# Altium footprint library altium_parts_templates_PCB.PcbLib: 93 footprints (part 6 of 6)
Each footprint in its own frame and in the unit in brackets; x right, y up, seen from the top. Pads: shape width x height; smd on the part's side, far side on the other; paste and mask are expansions set on the pad; w line width, h text height; cw(c..) or ccw(c..) is an arc to the next point about the centre after c.
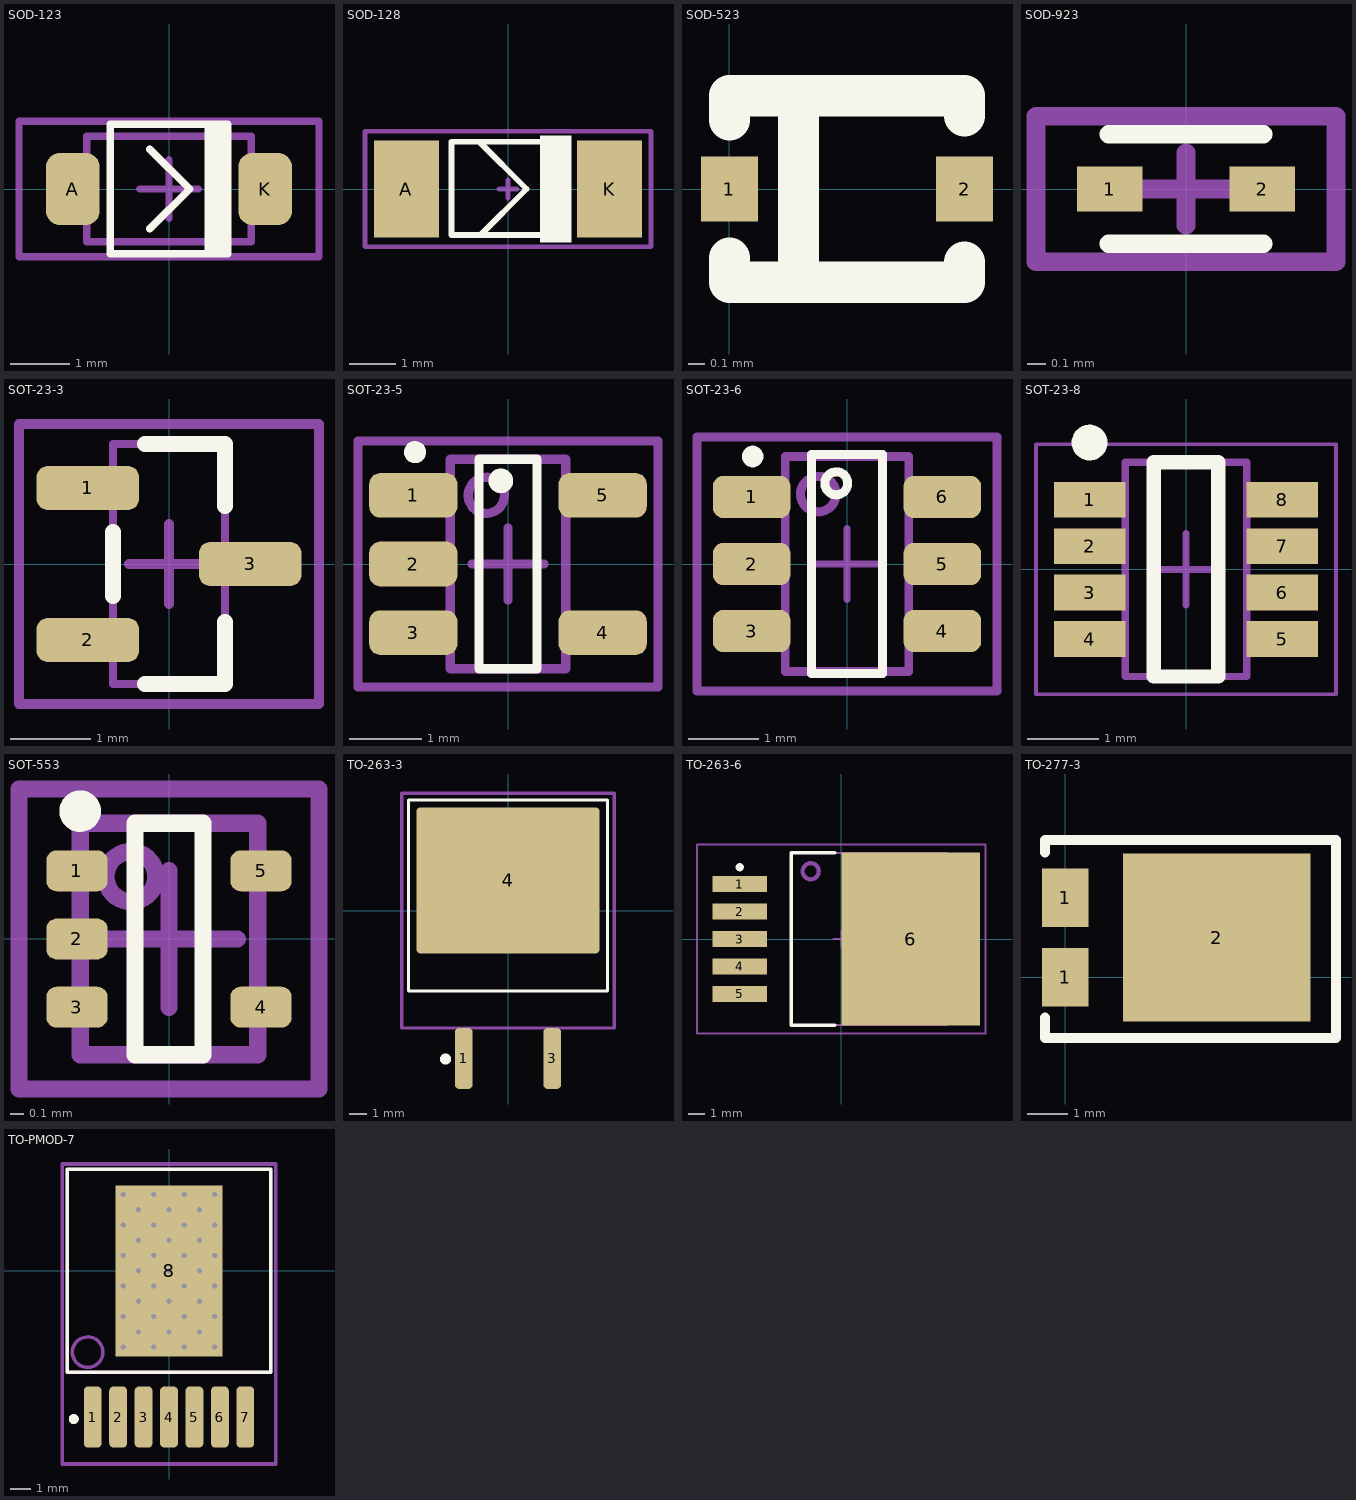
[diagram p5: the footprints below, top view; thin cyan lines are the x and y axes]

## SOD-123 [mm] "SOD-123"
height 1.35
pads (2):
  rrect50% 0.91x1.22 smd paste+0 mask+0.07: A(-1.635,0) K(1.635,0)
Top Overlay:
  rectangle: 0.6,-1.1 1,1.1
  lines w0.127: -0.325,-0.675 0.35,0 -0.325,0.675 ; -1,-1.1 1,-1.1 1,1.1 -1,1.1 -1,-1.1
Top Assembly Drawing:
  lines w0.127: -0.325,-0.675 0.35,0 -0.325,0.675 ; 0.954,-0.9 0.954,0.9 ; -1.4,-0.9 1.4,-0.9 1.4,0.9 -1.4,0.9 -1.4,-0.9
Top Courtyard:
  lines w0.127: -0.5,0 0.5,0 ; 0,-0.5 0,0.5 ; -2.55,-1.15 2.55,-1.15 2.55,1.15 -2.55,1.15 -2.55,-1.15
3D body "TSOP127P370X135-2N.step": height 1.35, standoff 0, extent -1.855,-0.9 1.855,0.9

## SOD-128 [mm] "SOD-128"
pads (2):
  rect 1.4x2.1 smd: A(-2.2,0) K(2.2,0)
Top Overlay:
  region: 1.375,1.15 1.375,-1.15 0.7,-1.15 0.7,1.15
  lines w0.127: 1.138,1.025 -1.225,1.025 ; 1.175,-1 -1.225,-1 ; -1.225,-1 -1.225,1.025 ; -1.225,-1 -0.6,-1 0.4,0 -0.625,1.025 -1.225,1.025
Top Courtyard:
  lines w0.102: -0.2,0 0.2,0 ; 0,-0.2 0,0.2 ; -3.1,-1.25 3.1,-1.25 3.1,1.25 -3.1,1.25 -3.1,-1.25

## SOD-523 [mm] "Vishay - SOD-523"
height 0.711
pads (2):
  rect 0.35x0.4 smd: 1(0,0) 2(1.45,0)
Top Overlay:
  lines w0.254: 0,-0.425 0,-0.575 1.2,-0.575 1.45,-0.575 1.45,-0.45 ; 0,0.425 0,0.575 1.2,0.575 1.45,0.575 1.45,0.45 ; 0.425,-0.575 0.425,0.575
3D body: height 0.71, standoff 0, extent 0.175,-0.5 1.275,0.5
3D body: height 0.2, standoff 0, extent -0.125,-0.15 0.375,0.15
3D body: height 0.2, standoff 0, extent 1.075,-0.15 1.575,0.15

## SOD-923 [mm] "SOD-923"
pads (2):
  rect 0.36x0.25 smd: 1(-0.42,0) 2(0.42,0)
Top Overlay:
  lines w0.102: -0.425,-0.3 0.425,-0.3 ; -0.425,0.3 0.425,0.3
Top Courtyard:
  lines w0.102: -0.25,0 0.25,0 ; 0,-0.2 0,0.2 ; -0.825,-0.4 -0.825,0.4 0.825,0.4 0.825,-0.4 -0.825,-0.4

## SOT-23-3 [mm] "SOT-23-3, TO-236-3, SC-59"
height 1.1
pads (3):
  rrect50% 1.28x0.55 smd mask+0.07: 1(-1.015,0.95) 2(-1.015,-0.95) 3(1.015,0)
Top Overlay:
  lines w0.2: -0.7,-0.4 -0.7,0.4 ; -0.3,-1.5 0.7,-1.5 0.7,-0.725 ; -0.3,1.5 0.7,1.5 0.7,0.725
Top Assembly Drawing:
  lines w0.1: -0.7,-1.5 -0.7,1.5 0.7,1.5 0.7,-1.5 -0.7,-1.5
Top Courtyard:
  lines w0.127: -0.5,0 0.5,0 ; 0,-0.5 0,0.5 ; -1.875,-1.75 -1.875,1.75 1.875,1.75 1.875,-1.75 -1.875,-1.75
3D body "FMMT560QTADICT-ND.step": height 1.1, standoff 0, extent -1.25,-1.5 1.25,1.5

## SOT-23-5 [mm] "SOT-23-5, TSOT-23-5"
height 1
pads (5):
  rrect50% 1.22x0.62 smd paste+0 mask+0.07: 1(-1.31,0.95) 2(-1.31,0) 3(-1.31,-0.95) 4(1.31,-0.95) 5(1.31,0.95)
Top Overlay:
  circle w0.2: c-0.1,1.15 r0.071
  circle w0.152: c-1.286,1.547 r0.076
  lines w0.127: -0.4,-1.45 0.4,-1.45 0.4,1.45 -0.4,1.45 -0.4,-1.45
Top Assembly Drawing:
  circle w0.127: c-0.3,0.95 r0.25
  lines w0.127: -0.8,-1.45 -0.8,1.45 0.8,1.45 0.8,-1.45 -0.8,-1.45
Top Courtyard:
  lines w0.127: -0.5,0 0.5,0 ; 0,-0.5 0,0.5 ; -2.075,-1.7 -2.075,1.7 2.075,1.7 2.075,-1.7 -2.075,-1.7
3D body "SOT23127P600-8N.step": height 0.87, standoff 0, extent -1.4,-1.45 1.4,1.45

## SOT-23-6 [mm] "SOT-23-6, TSOT-23-6"
height 1.1
pads (6):
  rrect50% 1.1x0.6 smd paste+0 mask+0.07: 1(-1.35,0.95) 2(-1.35,0) 3(-1.35,-0.95) 4(1.35,-0.95) 5(1.35,0) 6(1.35,0.95)
Top Overlay:
  circle w0.152: c-1.337,1.523 r0.076
  circle w0.127: c-0.152,1.143 r0.163
  lines w0.127: -0.5,-1.55 -0.5,1.55 0.5,1.55 0.5,-1.55 -0.5,-1.55
Top Assembly Drawing:
  circle w0.127: c-0.406,0.991 r0.251
  lines w0.127: -0.875,-1.525 0.875,-1.525 0.875,1.525 -0.875,1.525 -0.875,-1.525
Top Courtyard:
  lines w0.1: -0.5,0 0.5,0 ; 0,-0.5 0,0.5
  lines w0.127: -2.125,-1.8 2.125,-1.8 2.125,1.8 -2.125,1.8 -2.125,-1.8
3D body "SOT23127P600-8N.step": height 1.1, standoff 0, extent -1.525,-1.525 1.525,1.525

## SOT-23-8 [mm] "SOT-23-8"
height 1.45
pads (8):
  rect 1x0.5 smd: 1(-1.35,0.975) 2(-1.35,0.325) 3(-1.35,-0.325) 4(-1.35,-0.975) 5(1.35,-0.975) 6(1.35,-0.325) 7(1.35,0.325) 8(1.35,0.975)
Top Overlay:
  circle w0.25: c-1.35,1.775 r0.125
  lines w0.2: -0.45,-1.5 -0.45,1.5 0.45,1.5 0.45,-1.5 -0.45,-1.5
Top 3D Model:
  lines w0.1: -0.85,-1.5 -0.85,1.5 0.85,1.5 0.85,-1.5 -0.85,-1.5
Top Courtyard:
  lines w0.05: -2.1,-1.75 -2.1,1.75 2.1,1.75 2.1,-1.75 -2.1,-1.75
  lines w0.1: -0.5,0 0.5,0 ; 0,-0.5 0,0.5
3D body "SOT23-8.step": height 1.2, standoff 0, extent -1.4,-1.47 1.4,1.47

## SOT-553 [mm]
height 0.6
pads (5):
  rrect50% 0.45x0.3 smd paste+0.05 mask+0.05: 1(-0.675,0.5) 2(-0.675,0) 3(-0.675,-0.5) 4(0.675,-0.5) 5(0.675,0.5)
Top Overlay:
  circle w0.152: c-0.651,0.938 r0.076
  lines w0.127: -0.25,-0.85 0.25,-0.85 0.25,0.85 -0.25,0.85 -0.25,-0.85
Top Assembly Drawing:
  circle w0.127: c-0.279,0.457 r0.183
  lines w0.127: -0.65,-0.85 -0.65,0.85 0.65,0.85 0.65,-0.85 -0.65,-0.85
Top Courtyard:
  lines w0.127: -0.5,0 0.5,0 ; 0,-0.5 0,0.5 ; -1.1,-1.1 -1.1,1.1 1.1,1.1 1.1,-1.1 -1.1,-1.1
3D body "User Library-sot-553.STEP": height 0.49, standoff -0.01, extent -0.8,-0.8 0.8,0.8

## TO-263-3 [mm] "TO-263-3, D2PAK, TO-263AB"
height 4.83
pads (3):
  rrect50% 1.016x3.504 smd paste+0 mask+0.102: 1(-2.54,-8.475) 3(2.54,-8.475)
  rrect5% 10.49x8.38 smd paste-5.245 mask+0.102: 4(0,1.737)
Top Overlay:
  circle w0.381: c-3.581,-8.509 r0.127
  lines w0.175: -5.715,-4.6 -5.715,6.35 5.715,6.35 5.715,-4.6 -5.715,-4.6
Top Paste:
  region: 3.1,3.087 1.3,3.087 1.3,0.487 3.1,0.487
  region: 5.2,3.087 3.4,3.087 3.4,0.487 5.2,0.487
  region: 5.2,5.9 3.4,5.9 3.4,3.3 5.2,3.3
  region: 3.1,5.9 1.3,5.9 1.3,3.3 3.1,3.3
  region: 5.2,0.187 3.4,0.187 3.4,-2.413 5.2,-2.413
  region: 3.1,0.187 1.3,0.187 1.3,-2.413 3.1,-2.413
  rectangle: -1,-2.413 1,0.187
  rectangle: -3.1,-2.413 -1.3,0.187
  rectangle: -5.2,-2.413 -3.4,0.187
  rectangle: -1,3.3 1,5.9
  rectangle: -3.1,3.3 -1.3,5.9
  rectangle: -5.2,3.3 -3.4,5.9
  rectangle: -5.2,0.487 -3.4,3.087
  rectangle: -3.1,0.487 -1.3,3.087
  rectangle: -1,0.487 1,3.087
Top Courtyard:
  lines w0.175: -0.5,0 0,0 ; 0,-0.5 0,0 ; 0,0.5 0,0 ; 0.5,0 0,0 ; -6.096,-6.722 6.096,-6.722 6.096,6.74 -6.096,6.74 -6.096,-6.722
3D body "D2PAK.step": height 4.98, standoff -0.03, extent -5.054,-9.458 5.106,5.806

## TO-263-6 [mm] "TO-263-6, D2PAK (5 Leads + Tab), TO-263BA"
height 4.83
pads (6):
  rect 3.4x1 smd paste-0.05 mask+0.07: 1(-6.3,3.4) 2(-6.3,1.7) 3(-6.3,0) 4(-6.3,-1.7) 5(-6.3,-3.4)
  rect 8.6x10.7 smd paste-20 mask+0.07: 6(4.3,0)
Top Overlay:
  circle w0.25: c-6.3,4.45 r0.125
  lines w0.2: -0.4,-5.35 -3.1,-5.35 -3.1,5.35 -0.4,5.35
Top Paste:
  rectangle: 4.5,1.95 8.5,5.05
  rectangle: 4.5,-1.55 8.5,1.55
  rectangle: 4.5,-5.05 8.5,-1.95
  rectangle: 0.1,-5.05 4.1,-1.95
  rectangle: 0.1,-1.55 4.1,1.55
  rectangle: 0.1,1.95 4.1,5.05
Top Assembly Drawing:
  circle w0.254: c-1.9,4.2 r0.5
  lines w0.127: -3.1,-5.325 6.55,-5.325 6.55,5.325 -3.1,5.325 -3.1,-5.325
Top Courtyard:
  lines w0.127: -0.5,0 0.5,0 ; 0,-0.5 0,0.5 ; -8.95,-5.85 8.95,-5.85 8.95,5.85 -8.95,5.85 -8.95,-5.85
3D body "DPAK170P1520X483-6M.step": height 4.83, standoff 0, extent -7.08,-5.325 8.12,5.325

## TO-277-3 [mm]
pads (3):
  rect 1.15x1.45 smd: 1(0,0) 1(0,1.97)
  rect 4.65x4.15 smd: 2(3.75,0.985)
Top Overlay:
  lines w0.254: -0.5,-1 -0.5,-1.5 6.7,-1.5 6.7,3.4 -0.5,3.4 -0.5,3.1

## TO-PMOD-7 [mm]
pads (8):
  rrect50% 0.89x3.06 smd paste+0 mask+0.07: 1(-3.81,-7.305) 2(-2.54,-7.305) 3(-1.27,-7.305) 4(0,-7.305) 5(1.27,-7.305) 6(2.54,-7.305) 7(3.81,-7.305)
  rect 5.35x8.54 smd paste-10 mask+0.07: 8(0,0)
via -2.286,3.81 diameter 0.508 hole 0.254
via -0.762,3.81 diameter 0.508 hole 0.254
via 0.762,3.81 diameter 0.508 hole 0.254
via 2.286,3.81 diameter 0.508 hole 0.254
via 1.524,3.048 diameter 0.508 hole 0.254
via -1.524,3.048 diameter 0.508 hole 0.254
via 2.286,2.286 diameter 0.508 hole 0.254
via 0.762,2.286 diameter 0.508 hole 0.254
via -0.762,2.286 diameter 0.508 hole 0.254
via -2.286,2.286 diameter 0.508 hole 0.254
via 1.524,1.524 diameter 0.508 hole 0.254
via -1.524,1.524 diameter 0.508 hole 0.254
via 2.286,0.762 diameter 0.508 hole 0.254
via 0.762,0.762 diameter 0.508 hole 0.254
via -0.762,0.762 diameter 0.508 hole 0.254
via -2.286,0.762 diameter 0.508 hole 0.254
via 1.524,0 diameter 0.508 hole 0.254
via 0,0 diameter 0.508 hole 0.254
via -1.524,0 diameter 0.508 hole 0.254
via 2.286,-0.762 diameter 0.508 hole 0.254
via 0.762,-0.762 diameter 0.508 hole 0.254
via -0.762,-0.762 diameter 0.508 hole 0.254
via -2.286,-0.762 diameter 0.508 hole 0.254
via 1.524,-1.524 diameter 0.508 hole 0.254
via 0,-1.524 diameter 0.508 hole 0.254
via -1.524,-1.524 diameter 0.508 hole 0.254
via 2.286,-2.286 diameter 0.508 hole 0.254
via 0.762,-2.286 diameter 0.508 hole 0.254
via -0.762,-2.286 diameter 0.508 hole 0.254
via 1.524,-3.048 diameter 0.508 hole 0.254
via 0,-3.048 diameter 0.508 hole 0.254
via 2.286,-3.81 diameter 0.508 hole 0.254
via 0.762,-3.81 diameter 0.508 hole 0.254
via -0.762,-3.81 diameter 0.508 hole 0.254
via -2.286,-3.81 diameter 0.508 hole 0.254
via -2.286,-2.286 diameter 0.508 hole 0.254
via -1.524,-3.048 diameter 0.508 hole 0.254
via 0,3.048 diameter 0.508 hole 0.254
via 0,1.524 diameter 0.508 hole 0.254
Top Overlay:
  circle w0.25: c-4.757,-7.405 r0.125
  lines w0.175: -5.08,-5.08 5.08,-5.08 5.08,5.08 -5.08,5.08 -5.08,-5.08
Top Paste:
  region: 2.676,1.355 0.101,1.355 0.101,-1.355 2.676,-1.355
  region: 2.676,-1.555 0.101,-1.555 0.101,-4.265 2.676,-4.265
  region: 2.676,4.265 0.101,4.265 0.101,1.555 2.676,1.555
  rectangle: -2.676,1.555 -0.101,4.265
  rectangle: -2.676,-4.265 -0.101,-1.555
  rectangle: -2.676,-1.355 -0.101,1.355
Top Assembly Drawing:
  circle w0.175: c-4.064,-4.064 r0.762
  lines w0.175: -5.08,-5.08 5.08,-5.08 5.08,5.08 -5.08,5.08 -5.08,-5.08
Top Courtyard:
  lines w0.175: -0.762,0 0,0 ; 0,-0.762 0,0 ; 0,0.762 0,0 ; 0.762,0 0,0 ; -5.334,-9.652 -5.334,5.334 5.334,5.334 5.334,-9.652 -5.334,-9.652
3D body "LMZ-PMOD-7.step": height 4.57, standoff 0, extent -5.105,-8.825 5.055,4.951